# Altium schematic symbol library GyokuRe.SchLib: 1131 symbols (part 7 of 8) (continued)
## QSMO_4200 (continued)
QSMO - 4200 SERIES, 40MHz, SURFACE MOUNT CRYSTAL OSCILLATOR; Vendor: Digikey; Published: 5-Jan-2004; DatasheetDocument: 15-Jul-02; Publisher: Altium Limited; ComponentLink1Description: Digikey Part Link; ComponentLink2Description: Open Datasheet; ComponentLink2URL: H:\LIBRARY\LIBRARY.Datasheet\
footprint QSMO_4200 (Surface Mount 40MHz Crystal, 7.5mm x 5mm (LxW))
pcadlib QSMO_4200 (Surface Mount 40MHz Crystal, 7.5mm x 5mm (LxW))
pins: 1 E/D (in) "Low Disables Clock", 2 GND (power), 3 OUT (out) "Output", 4 VDD (power)

## R
designator R?, comment 1k
Resistor 1/4W; Value: R1/4W - 1K
footprint SM-1206 (Compoment SMD 120x60mil)
footprint R1/8W (R 1/8W, 2 pin, 300mil)
footprint R1/4W (R 1/4W, 2 Pin, 350mil)
footprint R1/4WD (R 1/4W, 2 Pin, 150mil)
pins: 1, 2

## R1/4W
designator R?, comment 1k
Resistor 1/4W; Value: R1/4W - 1K
footprint R1/4W (R 1/4W, 2 Pin, 350mil)
footprint R1/8W (R 1/8W, 2 pin, 300mil)
footprint R1/2W (R 1/2W, 2 pin, 400mil)
footprint R1/4WD (R 1/4W, 2 Pin, 150mil)
pins: 1, 2

## R1W
designator R?, comment 100
Resistor 1W; Value: R1W - 100
footprint R1W (R 1W, 2 pin, 500mil)
footprint R1WD (R 1W, 2 pin, 500mil)
pins: 1, 2

## R2W
designator R?, comment 47/2W
Resistor 2W; Value: R2W - 47
footprint R2W (R2W, 2 pin, 700mil)
footprint R2WD (R2W, 2 pin, 700mil)
pins: 1, 2

## R5W
designator R?, comment R5W - 0,47
Resistor 5W; Value: R5W - 0,47R
footprint R5W (R5W , 2 pin, 950mil)
footprint R5WD (R5W , 2 pin, 300 x 600 mil)
pins: 1 "R5W", 2 "R5W"

## RCV420
designator IC?
Precision 4mA to 20mA  CURRENT LOOP RECEIVER; Designed by: VanDungEvn; Value: RCV420
footprint DIP16/W0.3 (16 PIN, W 300mil, Pin to pin 100mil)
pins: 1 -in, 2 CT, 3 +in, 4 V-, 5 Ref-com, 7 Ref-NR, 8 Ref-Trim, 10 Ref-fa, 11 Ref-out, 12 Ref-in, 13 Rcv-Com, 14 Rcv-Out, 15 Rcv-fa, 16 V+

## REG104GA_0
designator U?
ComponentLink1Description: Digikey Part Link; ComponentLink2Description: Open Datasheet; ComponentLink2URL: H:\LIBRARY\LIBRARY.Datasheet\
pins: 1 VIN, 2 VOUT, 3 GND (power), 4 ADJUST, 5 ENABLE, 6 GND (power)

## Relay
designator RL?, comment Relay 8
footprint RELAY
pins: 1, 2, 3, 4, 5, 6, 7, 8

## RELAY5V
designator U?  (value not drawn)
Ro le 5V; Vendor: Digikey; Published: 13-April-2009; Publisher: Hoang Nguyen; ComponentLink1Description: Digikey Part Link; ComponentLink2Description: Open Datasheet; ComponentLink2URL: H:\LIBRARY\LIBRARY.Datasheet\
footprint Relay5V
pins: 1 NO2, 2 NC2, 3 COMMON2, 4 COIL2, 5 COIL1

## Relay 1
designator RL?, comment Relay 10A/12V
Relay SPDT,10A - 12VDC 5 Pin; Value: Relay SPDT, 10A, 12V
footprint RL_SPDT_10A (Relay SPDT, 5 pin, 10A,W 650mil, L 800mil, H 800mil)
pins: 1, 2, 3, 4, 5

## Relay 2
designator RL?, comment Relay 1A/5V
Relay DPDT; Discription: Relay DPDT 5V, 12V - 1A - 5A; Value: Relay - 5V - 1A
footprint RL_DPDT_5A (Reley DPDT, 8 pin, 5A, W500mil, L1100mil,H 950mil)
footprint RL_DPDT_1A (Reley DPDT, 8 pin, 1A, W400mil, L800mil,H 300mil)
pins: 1, 2, 3, 4, 5, 6, 7, 8

## RELAY 30A
designator U?
footprint RELAY 30A
pins: 1 COIL, 2 COIL, 3 GND, 4 GND, 5 NC, 6 NO

## Relay-DPDT
designator K?
Dual-Pole Dual-Throw Relay; Published: 24-Mar-1999; LatestRevisionDate: 17-Jul-2002; LatestRevisionNote: Re-released for DXP Platform.; PackageReference: DIP-P8; Publisher: Altium Limited
footprint Relay-8 (Relay; 8 Leads; Solder Pad 35mil)
pins: 1, 2, 3, 4, 5, 6, 7, 8

## Relay-SPDT
designator K?
Single-Pole Dual-Throw Relay; Published: 24-Mar-1999; LatestRevisionDate: 17-Jul-2002; LatestRevisionNote: Re-released for DXP Platform.; PackageReference: MODULE5B; Publisher: Altium Limited
footprint MODULE5B (DIP; 5 Round Pins; Row Space 15.24 mm; Pitch 2.54 mm)
simulation model SPDTRELAY (Spice Subcircuit)
pins: 1, 2, 3, 4, 5

## Relay.REED
designator RL?  (value not drawn)
Reed relè; Vendor: Digikey; Value: *; Published: 13-April-2009; Publisher: Hoang Nguyen; ComponentLink1Description: Digikey Part Link; ComponentLink2Description: Open Datasheet; ComponentLink2URL: H:\LIBRARY\LIBRARY.Datasheet\
footprint REED
pins: 1, 3, 4, 7

## Relay.REED2
designator RL?  (value not drawn)
Reed relè 2 way; Vendor: Digikey; Value: *; Published: 13-April-2009; Publisher: Hoang Nguyen; ComponentLink1Description: Digikey Part Link; ComponentLink2Description: Open Datasheet; ComponentLink2URL: H:\LIBRARY\LIBRARY.Datasheet\
footprint REED2
pins: 1, 2, 3, 4, 5, 6

## Relay.RL1
designator RL?  (value not drawn)
Relè body 29x12mm - 1 way - FEME; Vendor: Digikey; Value: *; Published: 13-April-2009; Publisher: Hoang Nguyen; ComponentLink1Description: Digikey Part Link; ComponentLink2Description: Open Datasheet; ComponentLink2URL: H:\LIBRARY\LIBRARY.Datasheet\
footprint RL1 (Relè body 29x12mm - 1 way - FEME)
pins: 1, 2, 3, 4, 5
text: RL1

## Relay.RL2
designator RL?  (value not drawn)
Relè body 29x12mm - 2 ways - FEME; Vendor: Digikey; Value: *; Published: 13-April-2009; Publisher: Hoang Nguyen; ComponentLink1Description: Digikey Part Link; ComponentLink2Description: Open Datasheet; ComponentLink2URL: H:\LIBRARY\LIBRARY.Datasheet\
footprint RL2 (Relè body 29x12mm - 2 way - FEME)
footprint RL2N (Relè body 29x12mm - 2 way - FEME)
pins: 1, 2, 3, 4, 5, 6, 7, 8

## RES_PACK_4R
designator R?
Isolated Resistor Network; Published: 24-Mar-1999; LatestRevisionDate: 17-Jul-2002; LatestRevisionNote: Re-released for DXP Platform.; PackageReference: SSOP16; Publisher: Altium Limited; Code_JEDEC: MO-150-AC
footprint Res Array-4 (Resistor Array, 9-pin)
pins: 1, 2, 3, 4, 5 Com

## RES_PACK_6R
designator R?
Isolated Resistor Network; Published: 24-Mar-1999; LatestRevisionDate: 17-Jul-2002; LatestRevisionNote: Re-released for DXP Platform.; PackageReference: SSOP16; Publisher: Altium Limited; Code_JEDEC: MO-150-AC
footprint Res Array-6 (Resistor Array; 6 Leads; Solder Pad 35mil)
pins: 1, 2, 3, 4, 5, 6, 7 Com

## RES_PACK_8R
designator R?
Isolated Resistor Network; Published: 24-Mar-1999; LatestRevisionDate: 17-Jul-2002; LatestRevisionNote: Re-released for DXP Platform.; PackageReference: SSOP16; Publisher: Altium Limited; Code_JEDEC: MO-150-AC
footprint Res Array (Resistor Array, 9-pin)
pins: 1, 2, 3, 4, 5, 6, 7, 8, 9 Com

## RES_SMD_0805
designator R?  value 0805  (hidden comment: RES_SMD_0805)
RES_0805; Published: 8-Jun-2000; LatestRevisionDate: 17-Jul-2002; LatestRevisionNote: Re-released for DXP Platform.; PackageReference: AXIAL-0.4; Publisher: Altium Limited
simulation model RESISTOR (Resistor)
signal-integrity model Res
footprint DIEN TRO 0805 (Chip Resistor; Body 2.0 x 1.3 mm (LxW typ))
pins: 1, 2

## RES_SMD_1206
designator R?  value 1206  (hidden comment: RES_SMD_1206)
RES_12; Published: 8-Jun-2000; LatestRevisionDate: 17-Jul-2002; LatestRevisionNote: Re-released for DXP Platform.; PackageReference: AXIAL-0.4; Publisher: Altium Limited
simulation model RESISTOR (Resistor)
signal-integrity model Res
footprint R1206
pins: 1, 2

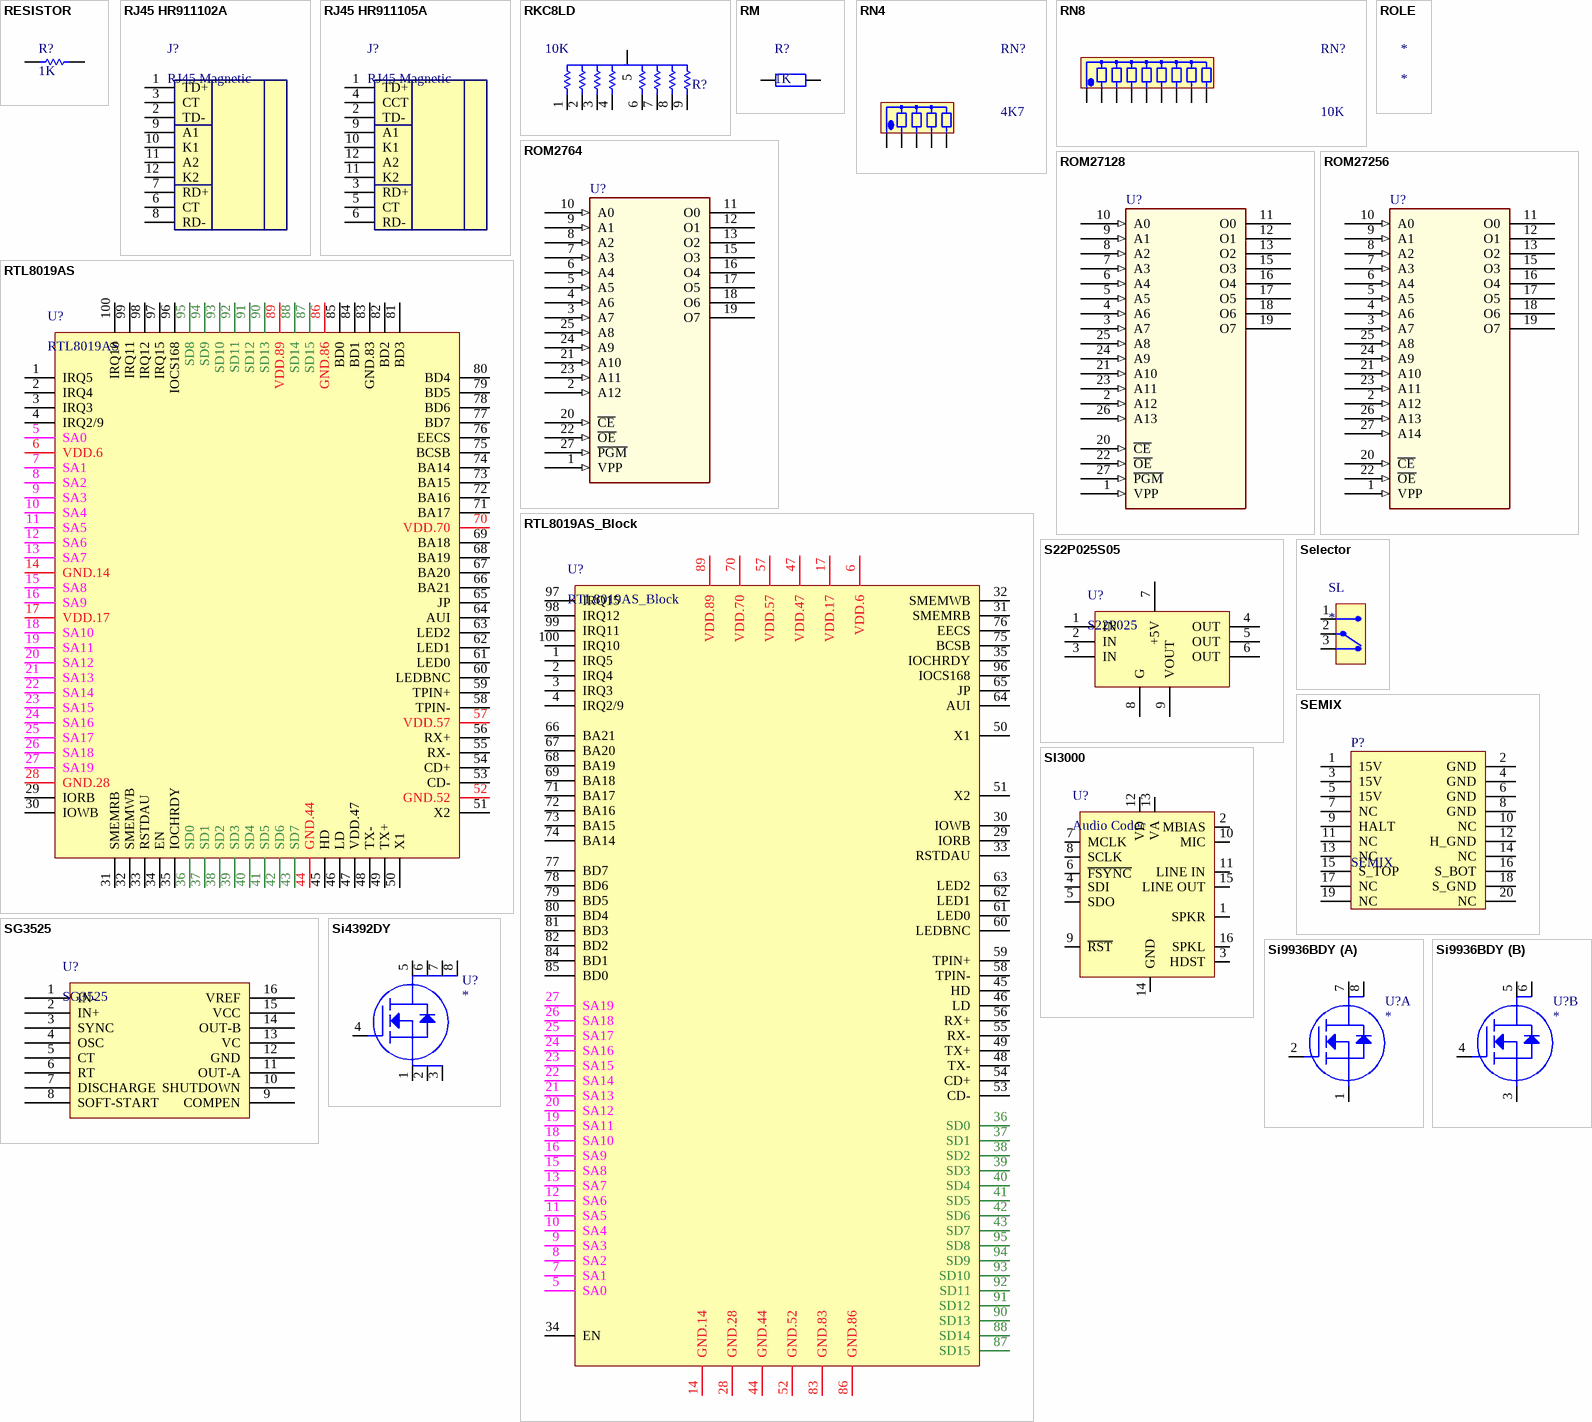
[diagram p38: symbols RESISTOR to Si9936BDY]

## RESISTOR
designator R?  value 1K  (hidden comment: RESISTOR)
Published: 8-Jun-2000; LatestRevisionDate: 17-Jul-2002; LatestRevisionNote: Re-released for DXP Platform.; PackageReference: AXIAL-0.3; Publisher: Altium Limited
footprint Res 49mm (10W) (Resistor; 2 Leads; 10W; Solder Pad 35mil)
footprint Res 52mm (15W) (Resistor; 2 Leads; 15W; Solder Pad 35mil)
footprint R-0805 (Chip Resistor; Body 2.0 x 1.3 mm (LxW typ))
footprint Res 10mm (1/2W) (Resistor; 2 Leads; 1/2W; Solder Pad 35mil)
footprint Res 25mm (5W) (Resistor; 2 Leads; 5W; Solder Pad 35mil)
footprint Res 18mm (1W) (Resistor; 2 Leads; 1W; Solder Pad 35mil)
footprint Res 25mm (3W) (Resistor; 2 Leads; 3W; Solder Pad 35mil)
pins: 1, 2

## RJ45 HR911102A
designator J?, comment RJ45 Magnetic
Price: 40.000VND; ComponentLink2Description: Open DataSheet; ComponentLink2URL: H:\LIBRARY\LIBRARY.Datasheet\RJ45.pdf
footprint RJ45 with magnetic
pins: 1 TD+, 2 TD-, 3 CT, 6 CT, 7 RD+, 8 RD-, 9 A1, 10 K1, 11 A2, 12 K2

## RJ45 HR911105A
designator J?, comment RJ45 Magnetic
Price: 40.000VND; ComponentLink2Description: Open DataSheet; ComponentLink2URL: H:\LIBRARY\LIBRARY.Datasheet\RJ45.pdf
footprint RJ45 with magnetic
pins: 1 TD+, 2 TD-, 3 RD+, 4 CCT, 5 CT, 6 RD-, 9 A1, 10 K1, 11 K2, 12 A2

## RKC8LD
designator R?, comment 10K
Resistor Pack 4x2; Value: 10K
footprint RN8 (R SIP8, 9 Pin)
pins: 1, 2, 3, 4, 5, 6, 7, 8, 9

## RM
designator R?, comment 1K
Resistor SMD; Value: 1K
footprint SM-1206 (Compoment SMD 120x60mil)
footprint SM-0805 (Compoment SMD 80x50mil)
pins: 1, 2

## RN4
designator RN?, comment 4K7
Resistor 4 (thanh); Value: Tro thanh 4K7
footprint RN4 (R SIP4, 5 Pin)
pins: 1, 2, 3, 4, 5

## RN8
designator RN?, comment 10K
Resistor 8 (Thanh); Value: Tro thanh 10K
footprint RN8 (R SIP8, 9 Pin)
pins: 1, 2, 3, 4, 5, 6, 7, 8, 9

## ROLE
designator *

## ROM2764
designator U?  (value not drawn)
ROM Memory; Vendor: Digikey; Published: 13-April-2009; Publisher: Hoang Nguyen; ComponentLink1Description: Digikey Part Link; ComponentLink2Description: Open Datasheet; ComponentLink2URL: H:\LIBRARY\LIBRARY.Datasheet\
pins: 1 VPP (in), 2 A12 (in), 3 A7 (in), 4 A6 (in), 5 A5 (in), 6 A4 (in), 7 A3 (in), 8 A2 (in), 9 A1 (in), 10 A0 (in), 11 O0 (hiz), 12 O1 (hiz), 13 O2 (hiz), 14 GND (power) hidden to GND, 15 O3 (hiz), 16 O4 (hiz), 17 O5 (hiz), 18 O6 (hiz), 19 O7 (hiz), 20 ~{CE} (in), 21 A10 (in), 22 ~{OE} (in), 23 A11 (in), 24 A9 (in), 25 A8 (in), 27 ~{PGM} (in), 28 VCC (power) hidden to VCC

## ROM27128
designator U?  (value not drawn)
Vendor: Digikey; Published: 13-April-2009; Publisher: Hoang Nguyen; ComponentLink1Description: Digikey Part Link; ComponentLink2Description: Open Datasheet; ComponentLink2URL: H:\LIBRARY\LIBRARY.Datasheet\
pins: 1 VPP (in), 2 A12 (in), 3 A7 (in), 4 A6 (in), 5 A5 (in), 6 A4 (in), 7 A3 (in), 8 A2 (in), 9 A1 (in), 10 A0 (in), 11 O0 (hiz), 12 O1 (hiz), 13 O2 (hiz), 14 GND (power) hidden to GND, 15 O3 (hiz), 16 O4 (hiz), 17 O5 (hiz), 18 O6 (hiz), 19 O7 (hiz), 20 ~{CE} (in), 21 A10 (in), 22 ~{OE} (in), 23 A11 (in), 24 A9 (in), 25 A8 (in), 26 A13 (in), 27 ~{PGM} (in), 28 VCC (power) hidden to VCC

## ROM27256
designator U?  (value not drawn)
Vendor: Digikey; Published: 13-April-2009; Publisher: Hoang Nguyen; ComponentLink1Description: Digikey Part Link; ComponentLink2Description: Open Datasheet; ComponentLink2URL: H:\LIBRARY\LIBRARY.Datasheet\
pins: 1 VPP (in), 2 A12 (in), 3 A7 (in), 4 A6 (in), 5 A5 (in), 6 A4 (in), 7 A3 (in), 8 A2 (in), 9 A1 (in), 10 A0 (in), 11 O0 (hiz), 12 O1 (hiz), 13 O2 (hiz), 14 GND (power) hidden to GND, 15 O3 (hiz), 16 O4 (hiz), 17 O5 (hiz), 18 O6 (hiz), 19 O7 (hiz), 20 ~{CE} (in), 21 A10 (in), 22 ~{OE} (in), 23 A11 (in), 24 A9 (in), 25 A8 (in), 26 A13 (in), 27 A14 (in), 28 VCC (power) hidden to VCC

## RTL8019AS
designator U?
Realtek Full-Duplex Ethernet  Controller with Plug and Play Function; Voltage: 5V; Price: 80.000VND; Manufacturer: Realtek; ComponentLink2Description: Open Datasheet; ComponentLink2URL: H:\LIBRARY\LIBRARY.Datasheet\RTL8019as.pdf
footprint Model Name (Footprint not found)
footprint RTL8019AS (100-Pin Ceramic Quad Flat Pack 0.635 mm Pitch, IPC Medium Density)
pins: 1 IRQ5 (power), 2 IRQ4 (power), 3 IRQ3, 4 IRQ2/9, 5 SA0, 6 VDD.6, 7 SA1, 8 SA2, 9 SA3, 10 SA4, 11 SA5, 12 SA6, 13 SA7, 14 GND.14 (power), 15 SA8, 16 SA9, 17 VDD.17, 18 SA10, 19 SA11, 20 SA12, 21 SA13, 22 SA14, 23 SA15, 24 SA16, 25 SA17, 26 SA18, 27 SA19, 28 GND.28, 29 IORB, 30 IOWB, 31 SMEMRB, 32 SMEMWB, 33 RSTDAU, 34 EN, 35 IOCHRDY, 36 SD0, 37 SD1, 38 SD2, 39 SD3, 40 SD4, 41 SD5, 42 SD6, 43 SD7, 44 GND.44, 45 HD, 46 LD, 47 VDD.47, 48 TX-, 49 TX+, 50 X1, 51 X2, 52 GND.52, 53 CD-, 54 CD+, 55 RX-, 56 RX+, 57 VDD.57, 58 TPIN-, 59 TPIN+, 60 LEDBNC, 61 LED0, 62 LED1, 63 LED2, 64 AUI, 65 JP, 66 BA21, 67 BA20, 68 BA19, 69 BA18, 70 VDD.70, 71 BA17, 72 BA16, 73 BA15, 74 BA14, 75 BCSB, 76 EECS, 77 BD7, 78 BD6, 79 BD5, 80 BD4, 81 BD3, 82 BD2, 83 GND.83, 84 BD1, 85 BD0, 86 GND.86, 87 SD15, 88 SD14, 89 VDD.89, 90 SD13, 91 SD12, 92 SD11, 93 SD10, 94 SD9, 95 SD8, 96 IOCS168, 97 IRQ15, 98 IRQ12, 99 IRQ11, 100 IRQ10

## RTL8019AS_Block
designator U?
Realtek Full-Duplex Ethernet  Controller with Plug and Play Function; Voltage: 5V; Price: 80.000VND; Manufacturer: Realtek; ComponentLink2Description: Open Datasheet; ComponentLink2URL: H:\LIBRARY\LIBRARY.Datasheet\RTL8019as.pdf
footprint Model Name (Footprint not found)
footprint RTL8019AS (100-Pin Ceramic Quad Flat Pack 0.635 mm Pitch, IPC Medium Density)
pins: 1 IRQ5 (power), 2 IRQ4 (power), 3 IRQ3, 4 IRQ2/9, 5 SA0, 6 VDD.6, 7 SA1, 8 SA2, 9 SA3, 10 SA4, 11 SA5, 12 SA6, 13 SA7, 14 GND.14 (power), 15 SA8, 16 SA9, 17 VDD.17, 18 SA10, 19 SA11, 20 SA12, 21 SA13, 22 SA14, 23 SA15, 24 SA16, 25 SA17, 26 SA18, 27 SA19, 28 GND.28, 29 IORB, 30 IOWB, 31 SMEMRB, 32 SMEMWB, 33 RSTDAU, 34 EN, 35 IOCHRDY, 36 SD0, 37 SD1, 38 SD2, 39 SD3, 40 SD4, 41 SD5, 42 SD6, 43 SD7, 44 GND.44, 45 HD, 46 LD, 47 VDD.47, 48 TX-, 49 TX+, 50 X1, 51 X2, 52 GND.52, 53 CD-, 54 CD+, 55 RX-, 56 RX+, 57 VDD.57, 58 TPIN-, 59 TPIN+, 60 LEDBNC, 61 LED0, 62 LED1, 63 LED2, 64 AUI, 65 JP, 66 BA21, 67 BA20, 68 BA19, 69 BA18, 70 VDD.70, 71 BA17, 72 BA16, 73 BA15, 74 BA14, 75 BCSB, 76 EECS, 77 BD7, 78 BD6, 79 BD5, 80 BD4, 81 BD3, 82 BD2, 83 GND.83, 84 BD1, 85 BD0, 86 GND.86, 87 SD15, 88 SD14, 89 VDD.89, 90 SD13, 91 SD12, 92 SD11, 93 SD10, 94 SD9, 95 SD8, 96 IOCS168, 97 IRQ15, 98 IRQ12, 99 IRQ11, 100 IRQ10

## S22P025S05
designator U?, comment S22P025
footprint S22P025S05 (Tamura)
pins: 1 IN, 2 IN, 3 IN, 4 OUT, 5 OUT, 6 OUT, 7 +5V, 8 G, 9 VOUT

## Selector
designator SL
ComponentLink2URL: H:\LIBRARY\LIBRARY.Datasheet\
footprint Selector (Footprint not found)
pins: 1, 2, 3

## SEMIX
designator P?
Header, 20-Pin, 2-Row; LatestRevisionDate: 17-Jul-2002; LatestRevisionNote: Re-released for DXP Platform.; Publisher: Altium Limited
footprint Header 10x2 (Connector; Header; 20 Position; 2 Rows; Solder Pad 35mil)
footprint M_Header 10x2 (Connector; Header; 20 Position; 2 Rows; Manufacture-Solder Pad 24mil)
pins: 1 15V, 2 GND, 3 15V, 4 GND, 5 15V, 6 GND, 7 NC, 8 GND, 9 HALT, 10 NC, 11 NC, 12 H_GND, 13 NC, 14 NC, 15 S_TOP, 16 S_BOT, 17 NC, 18 S_GND, 19 NC, 20 NC

## SG3525
designator U?
footprint DIP16 (DIP; 16 Leads; Row Spacing 7.62 mm; Pitch 2.54 mm)
pins: 1 IN-, 2 IN+, 3 SYNC, 4 OSC, 5 CT, 6 RT, 7 DISCHARGE, 8 SOFT-START, 9 COMPEN, 10 SHUTDOWN, 11 OUT-A, 12 GND, 13 VC, 14 OUT-B, 15 VCC, 16 VREF

## SI3000
designator U?, comment Audio Codec
VOICEBAND CODEC WITH MICROPHONE/SPEAKER DRIVE; Manufacturer: Silicon Lab; Power Supply: 3V3 - 5V; Headphone Resistor: 32 Ohm; Sample rate: 4-12 kHz; Mic Pre-Amp: 30dB
footprint SOIC16_150_N (Small Outline; 16 Leads; Body Width 3.5 mm; Pitch 1.27 mm)
pins: 1 SPKR, 2 MBIAS, 3 HDST, 4 SDI, 5 SDO, 6 ~{FSYNC}, 7 MCLK, 8 SCLK, 9 ~{RST}, 10 MIC, 11 LINE IN, 12 VD, 13 VA, 14 GND, 15 LINE OUT, 16 SPKL

## Si4392DY
designator U?
ComponentLink1Description: Digikey Part Link; ComponentLink2Description: Open Datasheet; ComponentLink2URL: H:\LIBRARY\LIBRARY.Datasheet\
pins: 1 S (power), 2 S (power), 3 S (power), 4 G, 5 D (power), 6 D (power), 7 D (power), 8 D (power)

## Si9936BDY
designator U?
ComponentLink1Description: Digikey Part Link; ComponentLink2Description: Open Datasheet; ComponentLink2URL: H:\LIBRARY\LIBRARY.Datasheet\
part A pins: 1 S (power), 2 G, 7 D (power), 8 D (power)
part B pins: 3 S (power), 4 G, 5 D (power), 6 D (power)

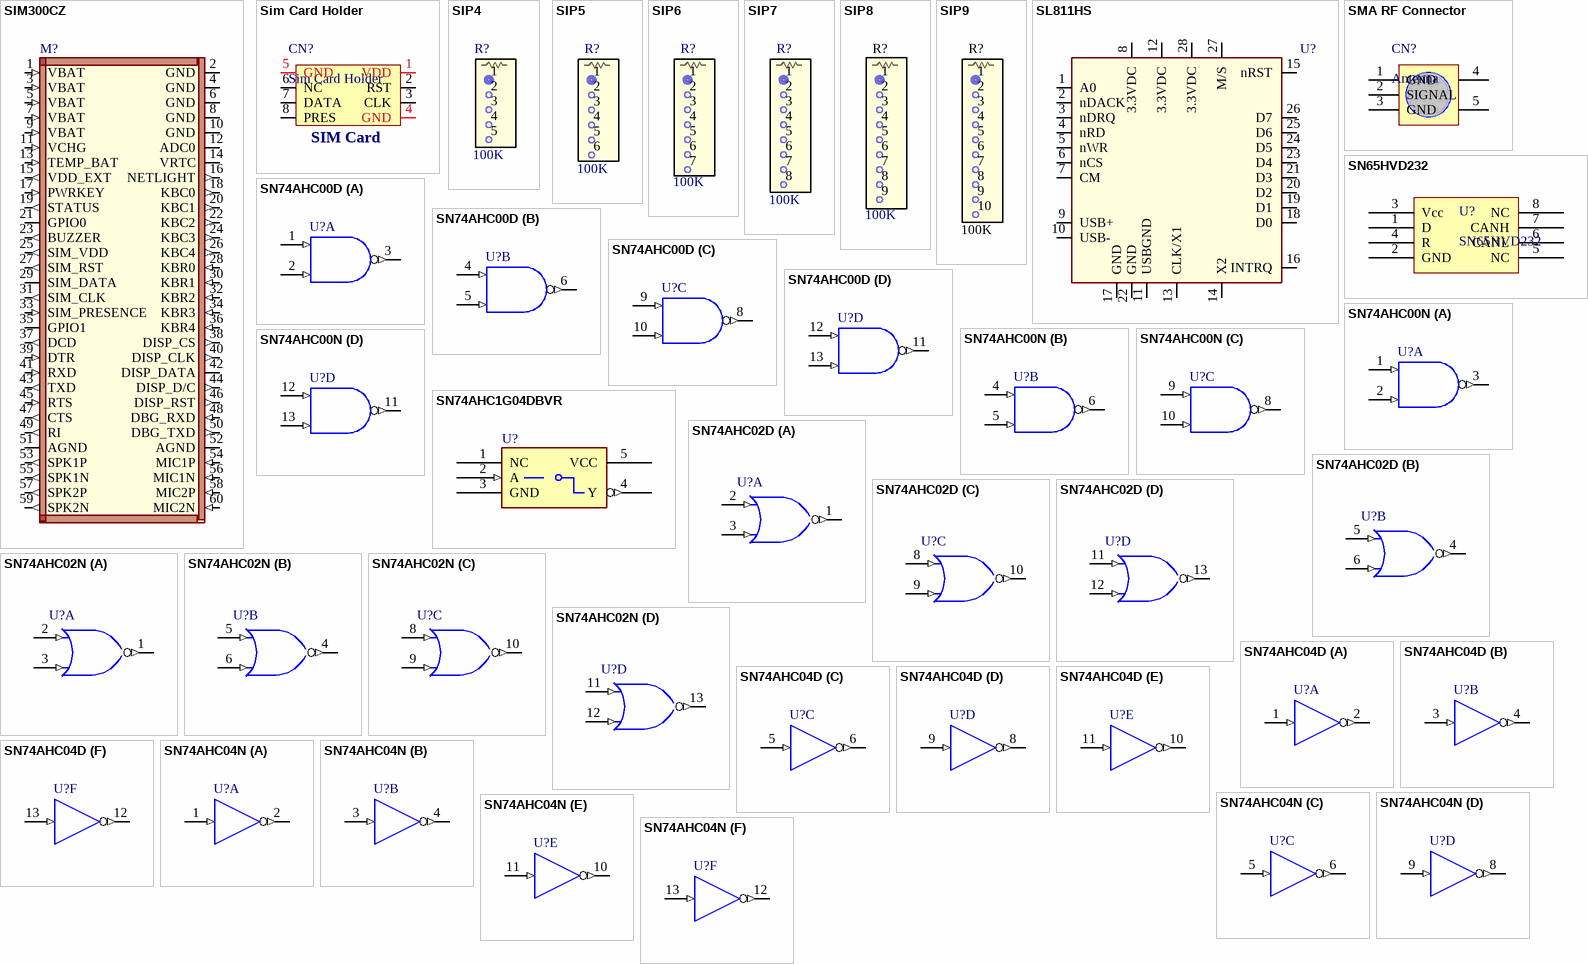
[diagram p39: symbols SIM300CZ to SN74AHC04N]

## SIM300CZ
designator M?  (value not drawn)
SIM300CZ; Manufacturer: SimCom; Publisher: Hoang Nguyen; ComponentLink1Description: Digikey Part link; ComponentLink2Description: Open DataSheet; ComponentLink2URL: H:\LIBRARY\LIBRARY.Datasheet\
footprint ASTRON 1590060-093
footprint SIM300CZ Module (GSM Module)
pins: 1 VBAT (in), 2 GND (power), 3 VBAT (in), 4 GND (power), 5 VBAT (in), 6 GND (power), 7 VBAT (in), 8 GND (power), 9 VBAT (in), 10 GND (power), 11 VCHG (in), 12 ADC0, 13 TEMP_BAT (in), 14 VRTC, 15 VDD_EXT (out), 16 NETLIGHT (out), 17 PWRKEY (in), 18 KBC0 (out), 19 STATUS (out), 20 KBC1 (out), 21 GPIO0 (io), 22 KBC2 (out), 23 BUZZER (out), 24 KBC3 (out), 25 SIM_VDD (out), 26 KBC4 (out), 27 SIM_RST (out), 28 KBR0 (in), 29 SIM_DATA (io), 30 KBR1 (in), 31 SIM_CLK (out), 32 KBR2 (in), 33 SIM_PRESENCE (in), 34 KBR3 (in), 35 GPIO1 (io), 36 KBR4 (in), 37 DCD (out), 38 DISP_CS (out), 39 DTR (in), 40 DISP_CLK (out), 41 RXD (in), 42 DISP_DATA (io), 43 TXD (out), 44 DISP_D/C (out), 45 RTS (in), 46 DISP_RST (out), 47 CTS (out), 48 DBG_RXD (in), 49 RI (out), 50 DBG_TXD (out), 51 AGND (power), 52 AGND (power), 53 SPK1P (out), 54 MIC1P (in), 55 SPK1N (out), 56 MIC1N (in), 57 SPK2P (out), 58 MIC2P (in), 59 SPK2N (out), 60 MIC2N (in)

## Sim Card Holder
designator CN?
ComponentLink2Description: Open DataSheet; ComponentLink2URL: H:\LIBRARY\LIBRARY.Datasheet\
footprint Sim card holder
pins: 1 VDD, 2 RST, 3 CLK, 4 GND, 5 GND, 6 NC, 7 DATA, 8 PRES
text: SIM Card
